# Altium footprint library connector.PcbLib: 227 footprints (part 10 of 15)
Each footprint in its own frame and in the unit in brackets; x right, y up, seen from the top. Pads: shape width x height; smd on the part's side, far side on the other; paste and mask are expansions set on the pad; w line width, h text height; cw(c..) or ccw(c..) is an arc to the next point about the centre after c.
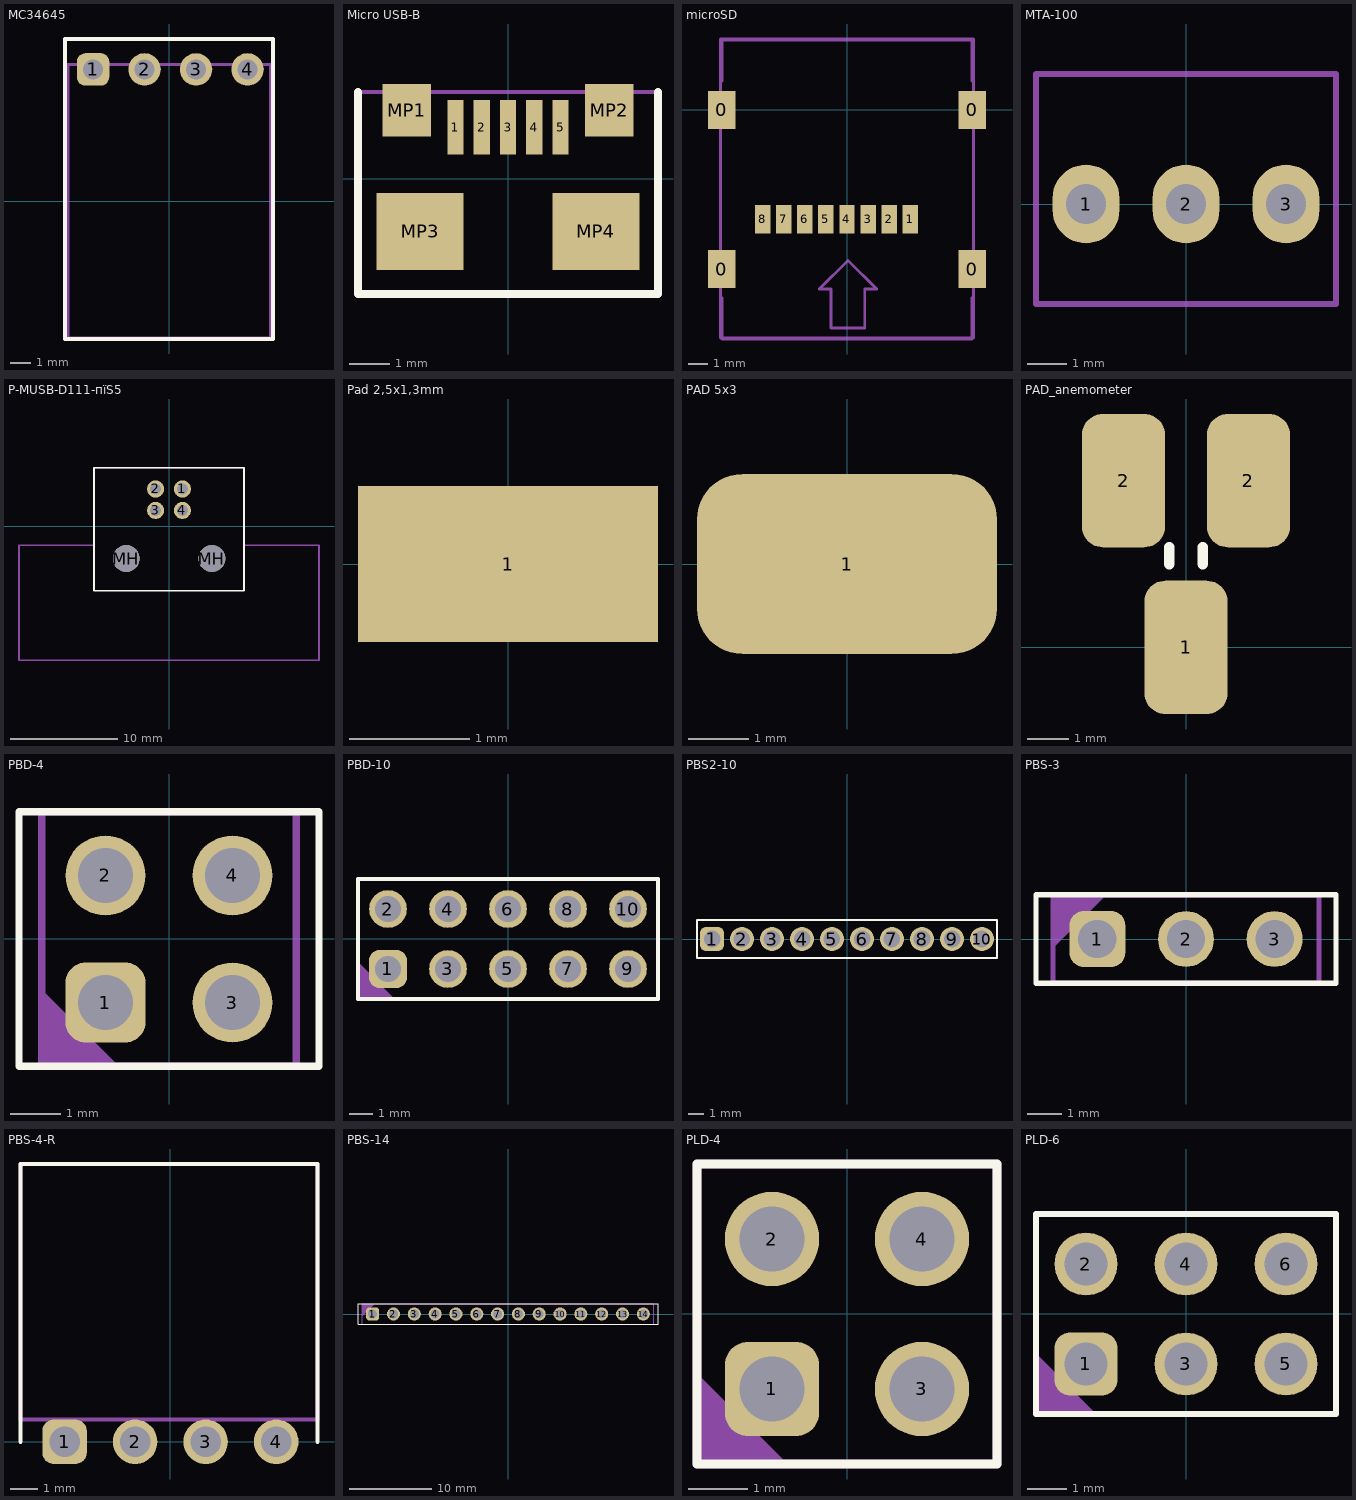
[diagram p9: the footprints below, top view; thin cyan lines are the x and y axes]

## MC34645 [mm] "MULTICOMP, Wire-To-Board Connector, 2.54 mm, 4 Contacts, Header, MC34 Series, Through Hole, 1 Rows"
height 5.8
pads (4):
  rrect50% 1.6x1.6 hole 1: 1(-3.75,6.5)
  round 1.6 hole 1: 2(-1.21,6.5) 3(1.33,6.5) 4(3.87,6.5)
Top Overlay:
  lines w0.2: -5.13,-6.8 -5.13,8 5.12,8 5.12,-6.8 -5.13,-6.8
Top Courtyard:
  lines w0.15: -5,-6.75 -5,6.75 5,6.75 5,-6.75 -5,-6.75
3D body "STEP-61900411021-rev1.stp": height 5.9, standoff -3.3, extent -5.02,-6.685 5.14,6.835

## Micro USB-B [mm]
pads (9):
  rect 0.4x1.35 smd: 1(-1.3,1.275) 2(-0.65,1.275) 3(0,1.275) 4(0.65,1.275) 5(1.3,1.275)
  rect 1.2x1.3 smd: MP1(-2.5,1.7) MP2(2.5,1.7)
  rect 2.15x1.9 smd: MP3(-2.175,-1.3) MP4(2.175,-1.3)
Top Overlay:
  lines w0.2: -3.71,2.15 -3.71,-2.85 3.71,-2.85 3.71,2.15
Mechanical 13:
  lines w0.1: -3.71,-2.85 -3.71,2.15 3.71,2.15 3.71,-2.85 -3.71,-2.85
3D body "DX4R005HJ5R2000.stp": height 2.59, standoff 0.01, extent -3.71,-3.14 3.71,2.335

## microSD [mm]
height 2
pads (12):
  rect 1.45x2 smd: 0(-6.53,-8.3) 0(-6.53,0) 0(6.53,-8.3) 0(6.53,0)
  rect 0.8x1.5 smd: 1(3.3,-5.7) 2(2.2,-5.7) 3(1.1,-5.7) 4(0,-5.7) 5(-1.1,-5.7) 6(-2.2,-5.7) 7(-3.3,-5.7) 8(-4.4,-5.7)
Mechanical 29:
  lines w0.15: -6.53,-9.8 -6.53,-11.95 0,-11.95 6.53,-11.95 6.53,-9.8 ; -6.53,1.5 -6.53,3.65 0,3.65 6.53,3.65 6.53,1.5 ; -6.6,-11.9 6.6,-11.9 6.6,1.5 6.6,3.7 -6.6,3.7 -6.6,1.5 -6.6,-11.9 ; -1.45,-9.35 0.05,-7.85 1.55,-9.35 0.925,-9.35 0.925,-11.375 0.05,-11.375 -0.825,-11.375 -0.825,-9.35 -1.45,-9.35
  text ".Designator" at -4,-2.3 h1
3D body "User Library-473521001_microSD.step": height 2, standoff 0.12, extent -7.1,-11.915 7,3.285

## MTA-100 [mm] "MTA-100 3 pins"
height 10
pads (3):
  oval 1.7x2 hole 1.016: 1(-2.54,0) 2(0,0) 3(2.54,0)
Mechanical 29:
  lines w0.15: -3.81,-2.54 3.81,-2.54 ; -3.81,-2.54 -3.81,3.302 ; -3.81,-2.54 3.81,-2.54 ; -3.81,-2.54 -3.81,3.302 ; -3.81,3.302 3.81,3.302 ; -3.81,3.302 3.81,3.302 ; 3.81,-2.54 3.81,3.302 ; 3.81,-2.54 3.81,3.302
  text ".Designator" at -3,0.2 h1

## P-MUSB-D111-пїЅ5 [mm]
height 13
pads (6):
  round 1.6 hole 1: 1(1.25,3.5) 2(-1.25,3.5) 3(-1.25,1.5) 4(1.25,1.5)
  round 2.5 hole 2.5 unplated: MH(-4,-2.99) MH(4,-2.99)
Top Overlay:
  lines w0.15: -7,-6 0,-6 7,-6 7,5.5 0,5.5 -7,5.5 -7,-6
Top Courtyard:
  lines w0.15: -14,-12.5 -14,-1.74 -7,-1.74 -7,5.5 0,5.5 7,5.5 7,-1.74 14,-1.74 14,-12.5 0,-12.5 -14,-12.5
3D body "P-MUSB-D111-�5.STEP": height 15.6, standoff -2.65, extent -14,-12.5 14,5.5

## Pad 2,5x1,3mm [mm]
pads (1):
  rect 2.5x1.3 smd: 1(0,0)

## PAD 5x3 [mm]
pads (1):
  rrect50% 5x3 smd: 1(0,0)

## PAD_anemometer [mm]
pads (3):
  rrect50% 2x3.2 smd paste+0 mask+0.102: 1(0,0) 2(-1.5,4) 2(1.5,4)
Top Overlay:
  lines w0.254: -0.4,2 -0.4,2.4 ; 0.4,2 0.4,2.4

## PBD-4 [mm]
pads (4):
  rrect50% 1.6x1.6 hole 1.1: 1(-1.27,-1.27)
  round 1.6 hole 1.1: 2(-1.27,1.27) 3(1.27,-1.27) 4(1.27,1.27)
Top Overlay:
  lines w0.15: -3,-2.54 3,-2.54 3,2.54 -3,2.54 -3,-2.54
Mechanical 29:
  region: -2.54,-2.54 -2.54,-1.016 -1.016,-2.54
  lines w0.15: -2.54,-2.54 -2.54,2.54 2.54,2.54 2.54,-2.54 -2.54,-2.54
3D body "DS1023-2x2SF11.stp": height 8.5, standoff -3, extent -2.94,-2.5 2.94,2.5

## PBD-10 [mm]
pads (10):
  rrect50% 1.6x1.6 hole 1.1: 1(-5.08,-1.27)
  round 1.6 hole 1.1: 2(-5.08,1.27) 3(-2.54,-1.27) 4(-2.54,1.27) 5(0,-1.27) 6(0,1.27) 7(2.54,-1.27) 8(2.54,1.27) 9(5.08,-1.27) 10(5.08,1.27)
Top Overlay:
  lines w0.15: -6.35,-2.54 6.35,-2.54 6.35,2.54 -6.35,2.54 -6.35,-2.54
Mechanical 29:
  region: -6.35,-2.5 -6.35,-0.976 -4.826,-2.5
  lines w0.15: -6.35,-2.54 -6.35,2.54 6.35,2.54 6.35,-2.54 -6.35,-2.54
  text ".Designator" at -3,-0.3 h1
3D body "PinSocket_2x05_P2.54mm_Vertical.step": height 7, standoff -3.1, extent -6.27,-2.56 6.43,2.52

## PBS2-10 [mm]
pads (10):
  rrect50% 1.6x1.6 hole 1.1: 1(-9,0)
  round 1.6 hole 1.1: 2(-7,0) 3(-5,0) 4(-3,0) 5(-1,0) 6(1,0) 7(3,0) 8(5,0) 9(7,0) 10(9,0)
Top Overlay:
  lines w0.15: -10,-1.27 10,-1.27 10,1.27 -10,1.27 -10,-1.27
3D body: height 4.3, standoff 0, extent -9.999,-1.269 9.999,1.269

## PBS-3 [mm]
pads (3):
  rrect50% 1.6x1.6 hole 1.1: 1(-2.54,0)
  round 1.6 hole 1.1: 2(0,0) 3(2.54,0)
Top Overlay:
  lines w0.15: -4.3,-1.27 4.3,-1.27 4.3,1.27 -4.3,1.27 -4.3,-1.27
Mechanical 29:
  region: -3.81,1.27 -2.286,1.27 -3.81,-0.254
  lines w0.15: -3.81,-1.27 -3.81,1.27 3.81,1.27 3.81,-1.27 -3.81,-1.27
  text ".Designator" at -3,-0.3 h1
3D body "DS1023-1x3SF11.stp": height 8.5, standoff -3, extent -4.21,-1.27 4.21,1.27

## PBS-4-R [mm]
pads (4):
  rrect50% 1.6x1.6 hole 1.1: 1(-3.81,0)
  round 1.6 hole 1.1: 2(-1.27,0) 3(1.27,0) 4(3.81,0)
Top Overlay:
  lines w0.15: -5.4,0 -5.4,10 0,10 5.3,10 5.3,0
Top Courtyard:
  lines w0.15: -5.4,0.8 5.3,0.8 5.3,10 -5.4,10 -5.4,0.8
3D body "SSQ-104-02-T-S-RA.stp": height 2.71, standoff -2.25, extent -5.334,-0.342 5.334,10.009

## PBS-14 [mm]
pads (14):
  rrect50% 1.6x1.6 hole 1.1: 1(-16.51,0)
  round 1.6 hole 1.1: 2(-13.97,0) 3(-11.43,0) 4(-8.89,0) 5(-6.35,0) 6(-3.81,0) 7(-1.27,0) 8(1.27,0) 9(3.81,0) 10(6.35,0) 11(8.89,0) 12(11.43,0) 13(13.97,0) 14(16.51,0)
Top Overlay:
  lines w0.15: -18.3,-1.27 18.3,-1.27 18.3,1.27 -18.3,1.27 -18.3,-1.27
Mechanical 29:
  region: -17.78,1.27 -16.256,1.27 -17.78,-0.254
  lines w0.15: -17.78,-1.27 -17.78,1.27 17.78,1.27 17.78,-1.27 -17.78,-1.27
  text ".Designator" at -3.5,-0.3 h1
3D body "PBS-14.stp": height 8.5, standoff -3, extent -18.18,-1.27 18.18,1.27

## PLD-4 [mm]
height 8
pads (4):
  rrect50% 1.6x1.6 hole 1.1: 1(-1.27,-1.27)
  round 1.6 hole 1.1: 2(-1.27,1.27) 3(1.27,-1.27) 4(1.27,1.27)
Top Overlay:
  lines w0.15: -2.54,-2.54 -2.54,2.54 2.54,2.54 2.54,-2.54 -2.54,-2.54
Mechanical 29:
  region: -2.54,-2.54 -2.54,-1.016 -1.016,-2.54
  lines w0.15: -2.54,-2.54 2.54,-2.54 2.54,2.54 -2.54,2.54 -2.54,-2.54
  text ".Designator" at -2,-0.3 h1
3D body "PLS-1.STEP": height 8.5, standoff -3, extent -2.54,-2.54 0,0
3D body "PLS-1.STEP": height 8.5, standoff -3, extent -2.54,0 0,2.54
3D body "PLS-1.STEP": height 8.5, standoff -3, extent 0,0 2.54,2.54
3D body "PLS-1.STEP": height 8.5, standoff -3, extent 0,-2.54 2.54,0

## PLD-6 [mm]
height 8
pads (6):
  rrect50% 1.6x1.6 hole 1.1: 1(-2.54,-1.27)
  round 1.6 hole 1.1: 2(-2.54,1.27) 3(0,-1.27) 4(0,1.27) 5(2.54,-1.27) 6(2.54,1.27)
Top Overlay:
  lines w0.15: -3.81,-2.54 3.81,-2.54 3.81,2.54 -3.81,2.54 -3.81,-2.54
Mechanical 29:
  region: -3.81,-2.54 -3.81,-1.016 -2.286,-2.54
  lines w0.15: -3.81,-2.54 -3.81,2.54 3.81,2.54 3.81,-2.54 -3.81,-2.54
  text ".Designator" at -3.5,-0.3 h1
3D body "PLS-1.STEP": height 8.5, standoff -3, extent 1.27,-2.54 3.81,0
3D body "PLS-1.STEP": height 8.5, standoff -3, extent 1.27,0 3.81,2.54
3D body "PLS-1.STEP": height 8.5, standoff -3, extent -1.27,-2.54 1.27,0
3D body "PLS-1.STEP": height 8.5, standoff -3, extent -1.27,0 1.27,2.54
3D body "PLS-1.STEP": height 8.5, standoff -3, extent -3.81,0 -1.27,2.54
3D body "PLS-1.STEP": height 8.5, standoff -3, extent -3.81,-2.54 -1.27,0